# Altium footprint library HidroanaPCBLib1.PcbLib: 88 footprints (part 2 of 6)
Each footprint in its own frame and in the unit in brackets; x right, y up, seen from the top. Pads: shape width x height; smd on the part's side, far side on the other; paste and mask are expansions set on the pad; w line width, h text height; cw(c..) or ccw(c..) is an arc to the next point about the centre after c.
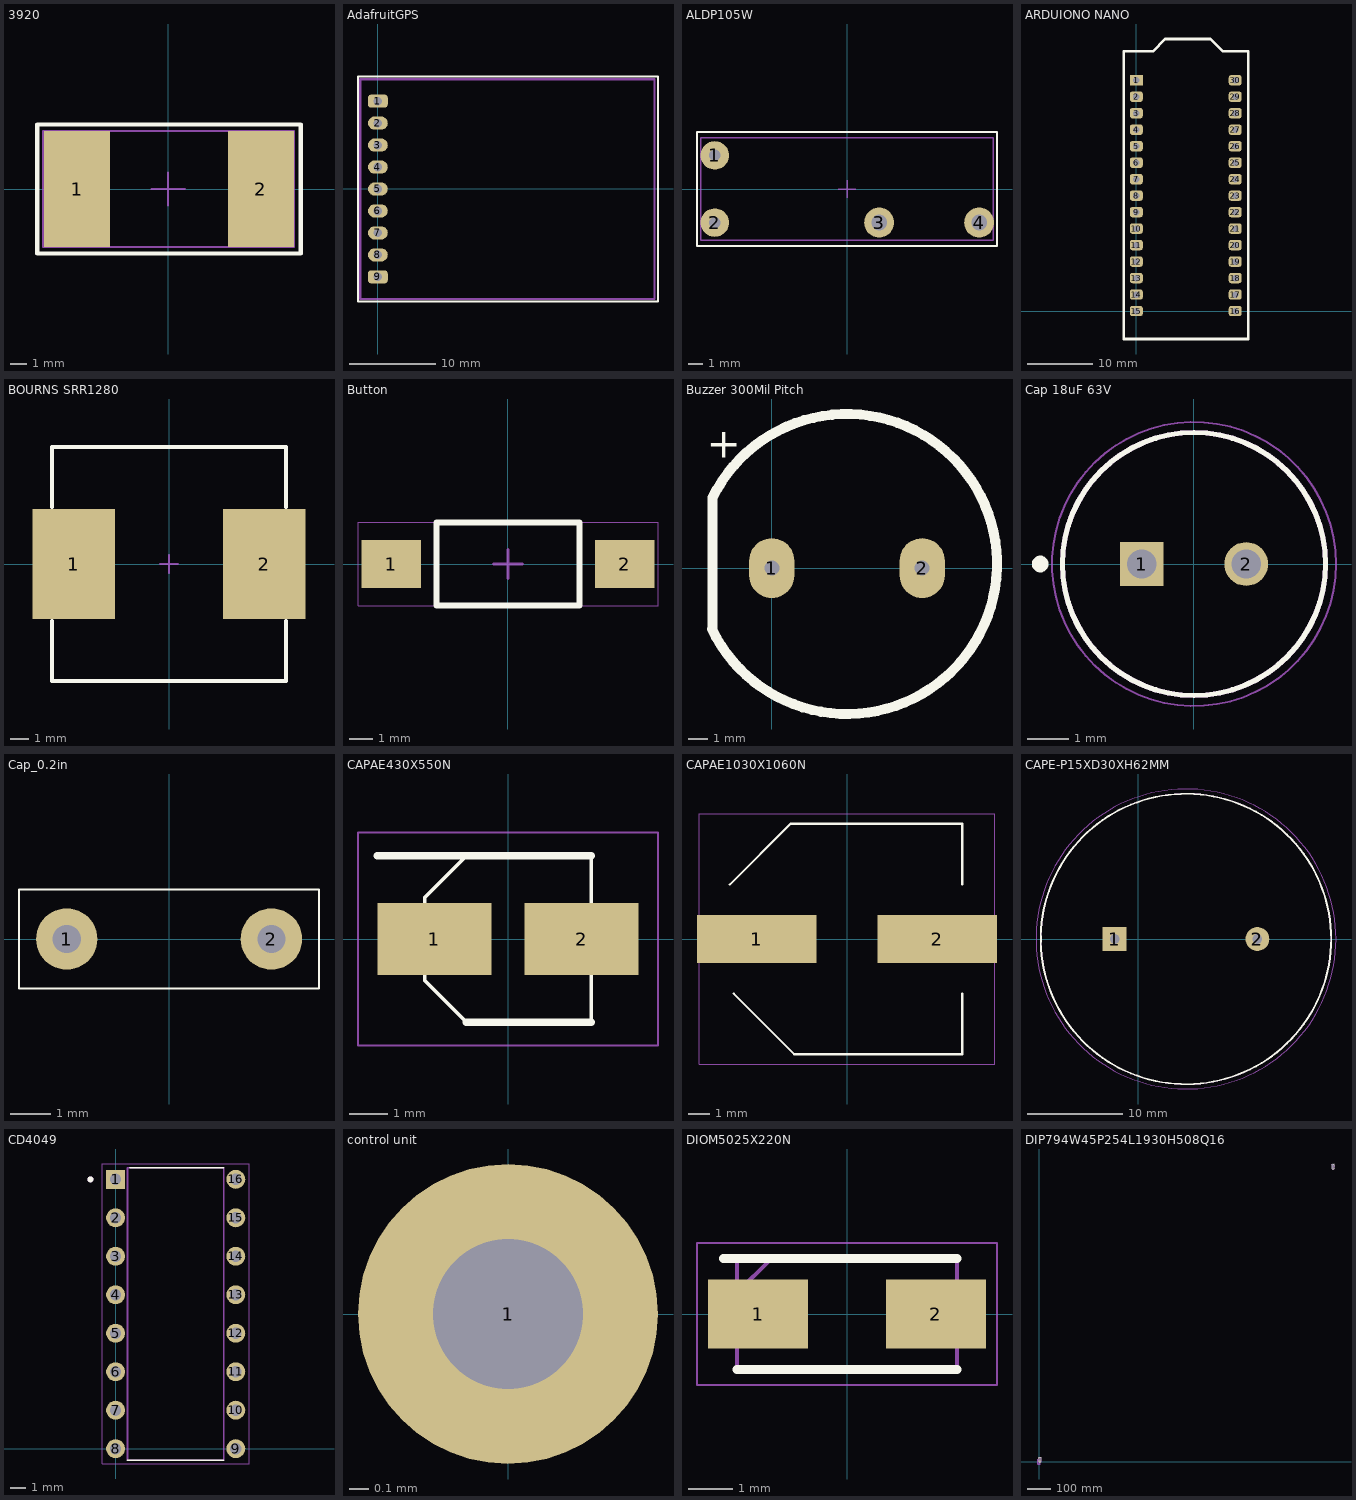
[diagram p1: the footprints below, top view; thin cyan lines are the x and y axes]

## 3920 [mm]
pads (2):
  rrect1% 4x7 smd: 1(-5.5,0) 2(5.6,0)
Top Overlay:
  lines w0.254: -7.898,-3.898 7.998,-3.898 7.998,3.898 -7.898,3.898 -7.898,-3.898
Top Component Center:
  lines w0.127: -1,0 1,0 ; 0,-1 0,1
  lines w0.128: -7.54,-3.5 7.6,-3.5 7.6,3.5 -7.54,3.5 -7.54,-3.5
Top Designator:
  text ".Designator" at -2.859,-0.287 h1.27
3D body "User Library-LRMAP3920.step": height 2.03, standoff 0.03, extent -5.321,-2.748 5.598,2.772

## AdafruitGPS [mil]
pads (9):
  rrect50% 90x60 hole 39.37: 1(0,400) 9(0,-400)
  oval 90x60 hole 39.37: 2(0,300) 3(0,200) 4(0,100) 5(0,0) 6(0,-100) 7(0,-200) 8(0,-300)
Top Overlay:
  lines w10: -90.55,-511.81 1275.59,-511.81 1275.59,511.81 -90.55,511.81 -90.55,-511.81
Top Component Center:
  lines w10: -80,-500.28 1260,-500.28 1260,500 -80,500 -80,-500.28
Top Designator:
  text ".Designator" at 610.05,-102.82 h50
3D body "Adafruit Ultimate GPS.step": height 65.75, standoff -3.94, extent -81.24,-505.28 1268.76,494.72

## ALDP105W [mm] "20.50x7.20x15.30mm(LxWxH)"
pads (4):
  round 2 hole 0.8 mask+0.102: 1(-9.25,2.35) 2(-9.25,-2.35)
  round 2.1 hole 1.1 mask+0.102: 3(2.25,-2.35) 4(9.25,-2.35)
Top Overlay:
  lines w0.127: -10.5,-4 10.5,-4 10.5,4 -10.5,4 -10.5,-4
Top Component Center:
  lines w0.1: -0.6,0 0.6,0 ; 0,-0.6 0,0.6 ; -10.25,-3.6 10.25,-3.6 10.25,3.6 -10.25,3.6 -10.25,-3.6
Top Designator:
  text ".Designator" at -3.434,-0.345 h1.52
3D body "ALDP105W.stp": height 14.9, standoff -3.4, extent -10.25,-3.5 10.05,3.5

## ARDUIONO NANO [mm]
pads (30):
  rect 2x1.6 hole 1: 1(0,35.56)
  rrect50% 2x1.6 hole 1: 2(0,33.02) 3(0,30.48) 4(0,27.94) 5(0,25.4) 6(0,22.86) 7(0,20.32) 8(0,17.78) 9(0,15.24) 10(0,12.7) 11(0,10.16) 12(0,7.62) 13(0,5.08) 14(0,2.54) 15(0,0) 16(15.24,0) 17(15.24,2.54) 18(15.24,5.08) 19(15.24,7.62) 20(15.24,10.16) 21(15.24,12.7) 22(15.24,15.24) 23(15.24,17.78) 24(15.24,20.32) 25(15.24,22.86) 26(15.24,25.4) 27(15.24,27.94) 28(15.24,30.48) 29(15.24,33.02) 30(15.24,35.56)
Top Overlay:
  lines w0.4: -1.904,-4.307 -1.904,40.005 2.54,40.005 4.445,41.91 6.985,41.91 11.43,41.91 13.335,40.005 17.216,40.005 17.216,-4.307 -1.904,-4.307
Top Designator:
  text ".Designator" at 0.51,17.272 h1.52
3D body "User Library-arduino_nano.STEP": height 13.1, standoff -5.5, extent -1.38,-3.82 16.62,41.18

## BOURNS SRR1280 [mm]
pads (2):
  rect 4.5x6 smd: 1(-5.2,0) 2(5.2,0)
Top Overlay:
  lines w0.2: -6.4,-3.1 -6.4,-6.4 6.4,-6.4 6.4,-3.1 ; -6.4,3.1 -6.4,6.4 6.4,6.4 6.4,3.1
Top Component Center:
  lines w0.1: -0.5,0 0.5,0 ; 0,-0.5 0,0.5 ; -6.4,-6.4 -6.4,6.4 6.4,6.4 6.4,-6.4 -6.4,-6.4
Top Designator:
  text ".Designator" at -2.859,-0.287 h1.27
3D body "SRR1280.STEP": height 7.9, standoff 0, extent -6.25,-6.25 6.25,6.25

## Button [mm] "SWITCH TACT 6.00x3.50 4.30mm 260gF SMT V/T"
pads (2):
  rect 2.5x2 smd mask+0.102: 1(-4.9,0) 2(4.9,0)
Top Overlay:
  lines w0.254: -3,-1.75 3,-1.75 3,1.75 -3,1.75 -3,-1.75
Top Component Center:
  lines w0.05: -6.3,-1.75 6.3,-1.75 6.3,1.75 -6.3,1.75 -6.3,-1.75
  lines w0.124: -0.6,0 0,0 ; 0,-0.6 0,0 ; 0,0.6 0,0 ; 0.6,0 0,0
Top Designator:
  text ".Designator" at -2.252,-0.226 h1
3D body "G73 button.STEP": height 2.6, standoff 0.1, extent -4,-1.75 4,1.75

## Buzzer 300Mil Pitch [mil]
pads (2):
  oval 90x120 hole 30: 1(0,0) 2(300,0)
Top Overlay:
  lines w20: -119.51,-121.61 ccw(c150,8.28) -118.1,141.06 -118.1,-120.2
  text "+" at -130,220 h60
Top Designator:
  text ".Designator" at -149.9,-19.99 h60
3D body "User Library-Buzzer14mm.step": height 292.37, standoff -119.05, extent -125.55,-275.2 425.63,275.98

## Cap 18uF 63V [mm]
pads (2):
  rect 1.05x1.05 hole 0.7: 1(-1.25,0)
  round 1.05 hole 0.7: 2(1.25,0)
Top Overlay:
  circle w0.127: c0,0 r3.15
  circle w0.2: c-3.683,0 r0.1
Top Component Center:
  circle w0.127: c0,0 r3.15
  circle w0.05: c0,0 r3.4
Top Designator:
  text ".Designator" at -7.618,-0.508 h1.52
3D body "step_temp.STEP": height 12.5, standoff -19, extent -3.15,-3.147 3.15,3.147

## Cap_0.2in [mil]
pads (2):
  round 60 hole 27.56: 1(-100,0) 2(100,0)
Top Overlay:
  lines w1.97: -146.63,-48.23 146.52,-48.23 146.52,48.26 -146.63,48.26 -146.63,-48.23
Top Designator:
  text ".Designator" at -299.9,-19.99 h60
3D body "Cap_5mm.step": height 261.22, standoff -191.54, extent -147.64,-49.21 147.64,49.21

## CAPAE430X550N [mm]
pads (2):
  rect 2.95x1.85 smd: 1(-1.9,0) 2(1.9,0)
Top Overlay:
  lines w0.1: -2.15,-1.075 -2.15,1.075 -1.075,2.15 2.15,2.15 2.15,-2.15 -1.075,-2.15 -2.15,-1.075
  lines w0.2: -3.375,2.15 2.15,2.15 ; -1.075,-2.15 2.15,-2.15
Top Component Center:
  lines w0.05: -3.875,-2.75 3.875,-2.75 3.875,2.75 -3.875,2.75 -3.875,-2.75
Top Designator:
  text ".Designator" at -7.618,-0.508 h1.52
3D body "EMVE630ADA1R0MD55G.stp": height 5.5, standoff 0, extent -2.65,-2.25 2.65,2.25

## CAPAE1030X1060N [mm]
pads (2):
  rect 5.5x2.2 smd: 1(-4.15,0) 2(4.15,0)
Top Overlay:
  lines w0.1: -5.4,2.5 -2.6,5.3 5.3,5.3 5.3,2.5 ; -5.213,-2.512 -2.425,-5.3 5.3,-5.3 5.3,-2.5
Top Component Center:
  lines w0.05: -6.8,-5.75 -6.8,5.75 6.8,5.75 6.8,-5.75 -6.8,-5.75
Top Designator:
  text ".Designator" at -7.618,-0.508 h1.52
3D body "CK1H221M-CRG10.stp": height 10.6, standoff 0, extent -5.6,-5.25 5.6,5.25

## CAPE-P15XD30XH62MM [mm]
height 62
pads (2):
  rect 2.5x2.5 hole 1: 1(-2.5,0)
  round 2.5 hole 1: 2(12.5,0)
Top Overlay:
  circle w0.2: c5,0 r15.25
Top Component Center:
  circle w0.1: c5,0 r15.25
  circle w0.05: c5,0 r15.75
Top Designator:
  text ".Designator" at -2.538,-0.508 h1.52
3D body "ELH2GM561Q60KT.stp": height 62, standoff -10, extent -10.5,-15.492 20.5,15.492

## CD4049 [mm] "cd4049 DIP"
pads (16):
  rect 1.248x1.248 hole 0.74: 1(0,17.78)
  round 1.248 hole 0.74: 2(0,15.24) 3(0,12.7) 4(0,10.16) 5(0,7.62) 6(0,5.08) 7(0,2.54) 8(0,0) 9(7.94,0) 10(7.94,2.54) 11(7.94,5.08) 12(7.94,7.62) 13(7.94,10.16) 14(7.94,12.7) 15(7.94,15.24) 16(7.94,17.78)
Top Overlay:
  circle w0.2: c-1.657,17.78 r0.1
  lines w0.127: 0.795,-0.763 7.145,-0.763 ; 0.944,18.543 7.145,18.543
Top Designator:
  text ".Designator" at -0.818,5.242 h1.52
asdasdasdasdasd:
  circle w0.2: c-1.657,17.78 r0.1
  lines w0.127: 0.795,-0.763 7.145,-0.763 7.145,18.543 0.795,18.543 0.795,-0.763
asd:
  lines w0.05: -0.874,-1.012 -0.874,18.792 8.814,18.792 8.814,-1.012 -0.874,-1.012
3D body "CD4049UBE.step": height 6.08, standoff -2.28, extent 0.155,-0.752 7.845,18.552

## control unit [mil]
pads (1):
  round 60 hole 30: 1(0,0)
3D body "PCB3.step": height 881.89, standoff 84.19, extent 0,0 2165.35,1181.1

## DIOM5025X220N [mm]
pads (2):
  rect 2.25x1.55 smd: 1(-2,0) 2(2,0)
Top Overlay:
  lines w0.2: -2.775,1.25 2.475,1.25 ; -2.475,-1.25 2.475,-1.25
Top Component Center:
  lines w0.05: -3.375,-1.6 3.375,-1.6 3.375,1.6 -3.375,1.6 -3.375,-1.6
  lines w0.1: -2.475,0.475 -1.7,1.25 ; -2.475,-1.25 2.475,-1.25 2.475,1.25 -2.475,1.25 -2.475,-1.25
Top Designator:
  text ".Designator" at -7.364,-0.508 h1.52
3D body "SS310-HF.stp": height 2.2, standoff 0, extent -2.475,-1.25 2.475,1.25

## DIP794W45P254L1930H508Q16 [mm]
height 5.08
pads (48):
  rect 1.248x1.248 hole 0.74: 1(0,17.78) 1(1234.694,1252.347) 1(1234.694,1252.347)
  round 1.248 hole 0.74: 2(0,15.24) 2(1234.694,1249.807) 2(1234.694,1249.807) 3(0,12.7) 3(1234.694,1247.267) 3(1234.694,1247.267) 4(0,10.16) 4(1234.694,1244.727) 4(1234.694,1244.727) 5(0,7.62) 5(1234.694,1242.187) 5(1234.694,1242.187) 6(0,5.08) 6(1234.694,1239.647) 6(1234.694,1239.647) 7(0,2.54) 7(1234.694,1237.107) 7(1234.694,1237.107) 8(0,0) 8(1234.694,1234.567) 8(1234.694,1234.567) 9(7.94,0) 9(1242.634,1234.567) 9(1242.634,1234.567) 10(7.94,2.54) 10(1242.634,1237.107) 10(1242.634,1237.107) 11(7.94,5.08) 11(1242.634,1239.647) 11(1242.634,1239.647) 12(7.94,7.62) 12(1242.634,1242.187) 12(1242.634,1242.187) 13(7.94,10.16) 13(1242.634,1244.727) 13(1242.634,1244.727) 14(7.94,12.7) 14(1242.634,1247.267) 14(1242.634,1247.267) 15(7.94,15.24) 15(1242.634,1249.807) 15(1242.634,1249.807) 16(7.94,17.78) 16(1242.634,1252.347) 16(1242.634,1252.347)
Top Overlay:
  circle w0.2: c1233.037,1252.347 r0.1
  circle w0.2: c1233.037,1252.347 r0.1
  circle w0.2: c-1.657,17.78 r0.1
  lines w0.127: 0.795,-0.763 7.145,-0.763 ; 0.944,18.543 7.145,18.543 ; 1235.489,1233.804 1241.839,1233.804 1235.489,1233.804 ; 1235.638,1253.11 1241.839,1253.11 1235.638,1253.11
asdasdasdasdasd:
  circle w0.2: c-5.627,8.89 r0.1
  circle w0.2: c1233.037,1252.347 r0.1
  circle w0.2: c1233.037,1252.347 r0.1
  circle w0.2: c-1.657,17.78 r0.1
  lines w0.127: 1235.489,1233.804 1235.489,1253.11 ; 1235.489,1233.804 1241.839,1233.804 ; 1235.489,1233.804 1235.489,1253.11 ; 1235.489,1233.804 1241.839,1233.804 ; 1235.489,1253.11 1241.839,1253.11 ; 1235.489,1253.11 1241.839,1253.11 ; 1241.839,1233.804 1241.839,1253.11 ; 1241.839,1233.804 1241.839,1253.11 ; -3.175,-9.653 3.175,-9.653 3.175,9.653 -3.175,9.653 -3.175,-9.653 ; 0.795,-0.763 0.795,18.543 7.145,18.543 7.145,-0.763 0.795,-0.763
asd:
  lines w0.05: 1233.82,1233.555 1243.508,1233.555 ; 1233.82,1233.555 1233.82,1253.359 ; 1233.82,1233.555 1243.508,1233.555 ; 1233.82,1233.555 1233.82,1253.359 ; 1233.82,1253.359 1243.508,1253.359 ; 1233.82,1253.359 1243.508,1253.359 ; 1243.508,1233.555 1243.508,1253.359 ; 1243.508,1233.555 1243.508,1253.359 ; -4.844,-9.902 -4.844,9.902 4.844,9.902 4.844,-9.902 -4.844,-9.902 ; -0.874,-1.012 8.814,-1.012 8.814,18.792 -0.874,18.792 -0.874,-1.012
3D body "step_temp.STEP": height 5.08, standoff -3.17, extent 1229.012,1237.996 1248.316,1248.918
3D body "step_temp.STEP": height 5.08, standoff -3.17, extent 1229.012,1237.996 1248.316,1248.918
3D body "CD4049UBE.step": height 1.28, standoff -7.08, extent 0.155,-0.752 7.845,18.552